# Altium footprint library UWRT_Footprint_Library_2020.PcbLib: 376 footprints (part 21 of 24)
Each footprint in its own frame and in the unit in brackets; x right, y up, seen from the top. Pads: shape width x height; smd on the part's side, far side on the other; paste and mask are expansions set on the pad; w line width, h text height; cw(c..) or ccw(c..) is an arc to the next point about the centre after c.
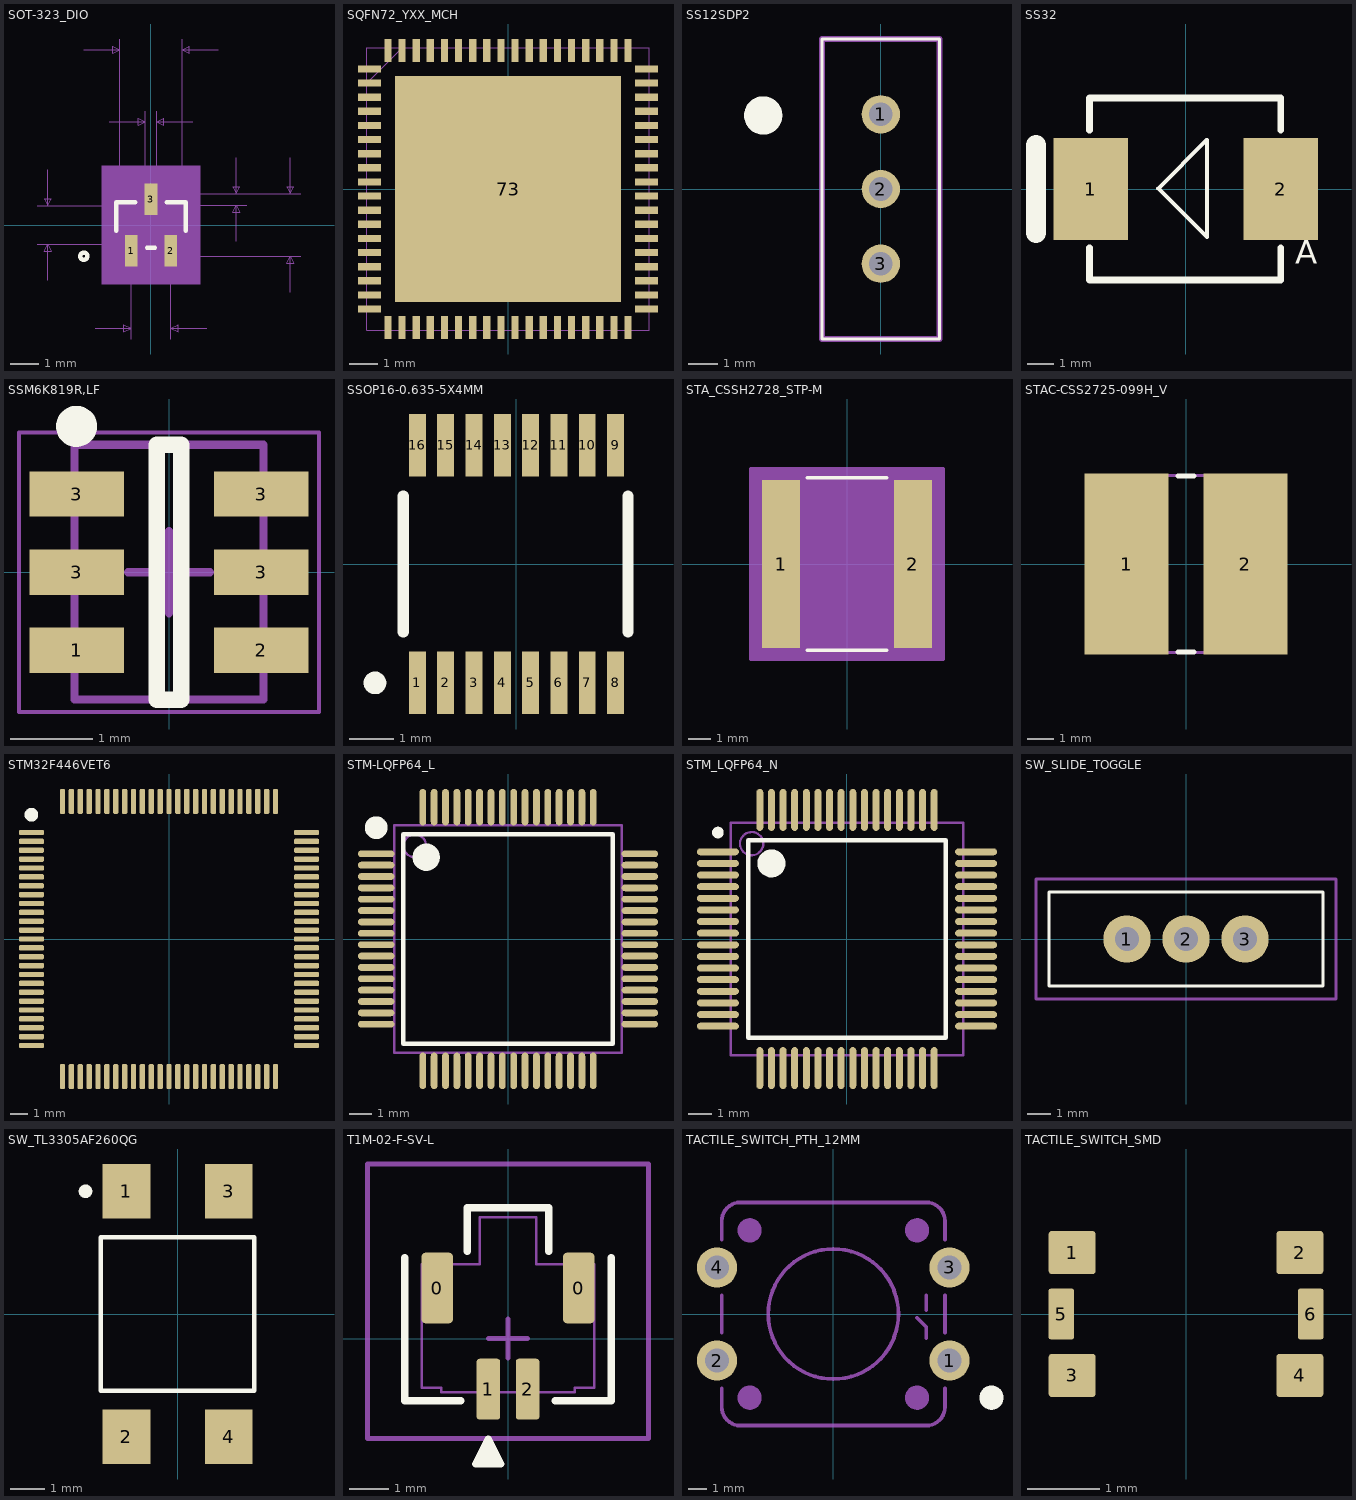
[diagram p20: the footprints below, top view; thin cyan lines are the x and y axes]

## SOT-323_DIO [mm]
pads (3):
  rect 0.451x1.111 smd paste+0 mask+0: 1(-0.7,-0.9) 2(0.7,-0.9) 3(0,0.9)
Top Overlay:
  circle w0.152: c-2.37,-1.1 r0.127
  lines w0.152: -1.227,-0.204 -1.227,0.802 -0.558,0.802 ; -0.142,-0.802 0.142,-0.802 ; 0.558,0.802 1.227,0.802 1.227,-0.204
Mechanical 5:
  region: -1.735,2.091 1.735,2.091 1.735,-2.091 -1.735,-2.091
Mechanical 7:
  lines w0.025: -4.021,-0.675 0,-0.675 ; -4.021,0.675 0,0.675 ; -3.64,-1.945 -3.64,-0.675 ; -3.64,1.945 -3.64,0.675 ; -2.37,6.18 -1.1,6.18 ; -1.97,-3.64 -0.7,-3.64 ; -1.47,3.64 -0.2,3.64 ; -1.1,0.675 -1.1,6.561 ; -0.7,-4.021 -0.7,-1.1 ; -0.2,1.1 -0.2,4.021 ; 0,-1.1 5.291,-1.1 ; 0,0.7 3.386,0.7 ; 0.2,1.1 0.2,4.021 ; 0.7,-4.021 0.7,-1.1 ; 1.1,0.675 1.1,6.561 ; 1.47,3.64 0.2,3.64 ; 1.97,-3.64 0.7,-3.64 ; 2.37,6.18 1.1,6.18 ; 3.005,-0.57 3.005,0.7 ; 3.005,2.37 3.005,1.1 ; 3.386,1.1 0,1.1 5.291,1.1 ; 4.91,-2.37 4.91,-1.1 ; 4.91,2.37 4.91,1.1 ; -3.64,-0.675 -3.513,-0.929 -3.767,-0.929 -3.64,-0.675 ; -3.64,0.675 -3.513,0.929 -3.767,0.929 -3.64,0.675 ; -1.1,6.18 -1.354,6.053 -1.354,6.307 -1.1,6.18 ; -0.7,-3.64 -0.954,-3.767 -0.954,-3.513 -0.7,-3.64 ; -0.2,3.64 -0.454,3.513 -0.454,3.767 -0.2,3.64 ; 0.2,3.64 0.454,3.513 0.454,3.767 0.2,3.64 ; 0.7,-3.64 0.954,-3.767 0.954,-3.513 0.7,-3.64 ; 1.1,6.18 1.354,6.053 1.354,6.307 1.1,6.18 ; 3.005,0.7 3.132,0.446 2.878,0.446 3.005,0.7 ; 3.005,1.1 3.132,1.354 2.878,1.354 3.005,1.1 ; 4.91,-1.1 5.037,-1.354 4.783,-1.354 4.91,-1.1 ; 4.91,1.1 5.037,1.354 4.783,1.354 4.91,1.1
  text "0.053in/1.35mm" at -8.593,-0.318 h0.64
  text "0.087in/2.2mm" at -2.064,6.688 h0.64
  text "0.016in/0.4mm" at -2.064,4.148 h0.64
  text "0.055in/1.4mm" at -2.064,-4.783 h0.64
  text "0.016in/0.4mm" at 3.513,0.583 h0.64
  text "0.087in/2.2mm" at 5.418,-0.318 h0.64
  text "Alt 2 Padstyle: OX90Y60D30P" at -8.572,-13.521 h1.27
  text "Alt 1 Padstyle: OX60Y90D30P" at -8.572,-11.616 h1.27
  text "Bottom Padstyle: RX17p75Y43p75D0T" at -10.477,-9.711 h1.27
  text "Top Padstyle: RX17p75Y43p75D0T" at -9.525,-7.806 h1.27
Mechanical 13:
  circle w0: c-0.846,-0.421 r0.127
  lines w0.025: -1.1,-0.675 -1.1,0.675 1.1,0.675 1.1,-0.675 -1.1,-0.675 ; -0.9,-1.1 -0.5,-1.1 -0.5,-0.675 -0.9,-0.675 -0.9,-1.1 ; -0.2,0.675 -0.2,1.1 0.2,1.1 0.2,0.675 -0.2,0.675 ; 0.5,-1.1 0.9,-1.1 0.9,-0.675 0.5,-0.675 0.5,-1.1
Mechanical 15:
  region: 1.1,-0.675 -1.1,-0.675 -1.1,0.675 1.1,0.675
  region: -1.354,-0.929 -1.354,0.929 -0.479,0.929 -0.479,1.71 0.479,1.71 0.479,0.929 1.354,0.929 1.354,-0.929 1.179,-0.929 1.179,-1.71 -1.179,-1.71 -1.179,-0.929
  lines w0.152: -1.354,-0.929 -1.179,-0.929 -1.179,-1.71 1.179,-1.71 1.179,-0.929 1.354,-0.929 1.354,0.929 0.479,0.929 0.479,1.71 -0.479,1.71 -0.479,0.929 -1.354,0.929 -1.354,-0.929
3D body: height 0.25, standoff 0, extent 0,0 0.254,0.254
3D body "SOT-323_DIO.step": height 1, standoff 0, extent -1.1,-1.1 1.1,1.1

## SQFN72_YXX_MCH [mil]
pads (73):
  rect 32x10 smd paste+0 mask+0: 1(-193,167.32) 2(-193,147.64) 3(-193,127.95) 4(-193,108.27) 5(-193,88.58) 6(-193,68.9) 7(-193,49.21) 8(-193,29.53) 9(-193,9.84) 10(-193,-9.84) 11(-193,-29.53) 12(-193,-49.21) 13(-193,-68.9) 14(-193,-88.58) 15(-193,-108.27) 16(-193,-127.95) 17(-193,-147.64) 18(-193,-167.32) 37(193,-167.32) 38(193,-147.64) 39(193,-127.95) 40(193,-108.27) 41(193,-88.58) 42(193,-68.9) 43(193,-49.21) 44(193,-29.53) 45(193,-9.84) 46(193,9.84) 47(193,29.53) 48(193,49.21) 49(193,68.9) 50(193,88.58) 51(193,108.27) 52(193,127.95) 53(193,147.64) 54(193,167.32)
  rect 10x32 smd paste+0 mask+0: 19(-167.32,-193) 20(-147.64,-193) 21(-127.95,-193) 22(-108.27,-193) 23(-88.58,-193) 24(-68.9,-193) 25(-49.21,-193) 26(-29.53,-193) 27(-9.84,-193) 28(9.84,-193) 29(29.53,-193) 30(49.21,-193) 31(68.9,-193) 32(88.58,-193) 33(108.27,-193) 34(127.95,-193) 35(147.64,-193) 36(167.32,-193) 55(167.32,193) 56(147.64,193) 57(127.95,193) 58(108.27,193) 59(88.58,193) 60(68.9,193) 61(49.21,193) 62(29.53,193) 63(9.84,193) 64(-9.84,193) 65(-29.53,193) 66(-49.21,193) 67(-68.9,193) 68(-88.58,193) 69(-108.27,193) 70(-127.95,193) 71(-147.64,193) 72(-167.32,193)
  rect 315x315 smd paste-157 mask+0: 73(0,0)
Top Paste:
  region: 153.56,-108.94 108.94,-108.94 108.94,-153.56 153.56,-153.56
  region: 153.56,-56.44 108.94,-56.44 108.94,-101.06 153.56,-101.06
  region: 153.56,-3.94 108.94,-3.94 108.94,-48.56 153.56,-48.56
  region: 153.56,48.56 108.94,48.56 108.94,3.94 153.56,3.94
  region: 153.56,101.06 108.94,101.06 108.94,56.44 153.56,56.44
  region: 153.56,153.56 108.94,153.56 108.94,108.94 153.56,108.94
  region: 101.06,-108.94 56.44,-108.94 56.44,-153.56 101.06,-153.56
  region: 101.06,-56.44 56.44,-56.44 56.44,-101.06 101.06,-101.06
  region: 101.06,-3.94 56.44,-3.94 56.44,-48.56 101.06,-48.56
  region: 101.06,48.56 56.44,48.56 56.44,3.94 101.06,3.94
  region: 101.06,101.06 56.44,101.06 56.44,56.44 101.06,56.44
  region: 101.06,153.56 56.44,153.56 56.44,108.94 101.06,108.94
  region: 48.56,-108.94 3.94,-108.94 3.94,-153.56 48.56,-153.56
  region: 48.56,-56.44 3.94,-56.44 3.94,-101.06 48.56,-101.06
  region: 48.56,-3.94 3.94,-3.94 3.94,-48.56 48.56,-48.56
  region: 48.56,48.56 3.94,48.56 3.94,3.94 48.56,3.94
  region: 48.56,101.06 3.94,101.06 3.94,56.44 48.56,56.44
  region: 48.56,153.56 3.94,153.56 3.94,108.94 48.56,108.94
  region: -3.94,-108.94 -48.56,-108.94 -48.56,-153.56 -3.94,-153.56
  region: -3.94,-56.44 -48.56,-56.44 -48.56,-101.06 -3.94,-101.06
  region: -3.94,-3.94 -48.56,-3.94 -48.56,-48.56 -3.94,-48.56
  region: -3.94,48.56 -48.56,48.56 -48.56,3.94 -3.94,3.94
  region: -3.94,101.06 -48.56,101.06 -48.56,56.44 -3.94,56.44
  region: -3.94,153.56 -48.56,153.56 -48.56,108.94 -3.94,108.94
  region: -56.44,-108.94 -101.06,-108.94 -101.06,-153.56 -56.44,-153.56
  region: -56.44,-56.44 -101.06,-56.44 -101.06,-101.06 -56.44,-101.06
  region: -56.44,-3.94 -101.06,-3.94 -101.06,-48.56 -56.44,-48.56
  region: -56.44,48.56 -101.06,48.56 -101.06,3.94 -56.44,3.94
  region: -56.44,101.06 -101.06,101.06 -101.06,56.44 -56.44,56.44
  region: -56.44,153.56 -101.06,153.56 -101.06,108.94 -56.44,108.94
  region: -108.94,-108.94 -153.56,-108.94 -153.56,-153.56 -108.94,-153.56
  region: -108.94,-56.44 -153.56,-56.44 -153.56,-101.06 -108.94,-101.06
  region: -108.94,-3.94 -153.56,-3.94 -153.56,-48.56 -108.94,-48.56
  region: -108.94,48.56 -153.56,48.56 -153.56,3.94 -108.94,3.94
  region: -108.94,101.06 -153.56,101.06 -153.56,56.44 -108.94,56.44
  region: -108.94,153.56 -153.56,153.56 -153.56,108.94 -108.94,108.94
Mechanical 13:
  lines w1: -197,147 -147,197 ; -197,-197 -197,197 197,197 197,-197 -197,-197 ; -197,-173.32 -197,-161.32 -197,-173.32 ; -197,-153.64 -197,-141.64 -197,-153.64 ; -197,-133.95 -197,-121.95 -197,-133.95 ; -197,-114.27 -197,-102.27 -197,-114.27 ; -197,-94.58 -197,-82.58 -197,-94.58 ; -197,-74.9 -197,-62.9 -197,-74.9 ; -197,-55.21 -197,-43.21 -197,-55.21 ; -197,-35.53 -197,-23.53 -197,-35.53 ; -197,-15.84 -197,-3.84 -197,-15.84 ; -197,3.84 -197,15.84 -197,3.84 ; -197,23.53 -197,35.53 -197,23.53 ; -197,43.21 -197,55.21 -197,43.21 ; -197,62.9 -197,74.9 -197,62.9 ; -197,82.58 -197,94.58 -197,82.58 ; -197,102.27 -197,114.27 -197,102.27 ; -197,121.95 -197,133.95 -197,121.95 ; -197,141.64 -197,153.64 -197,141.64 ; -197,161.32 -197,173.32 -197,161.32 ; -173.32,-197 -161.32,-197 -173.32,-197 ; -173.32,197 -161.32,197 -173.32,197 ; -153.64,-197 -141.64,-197 -153.64,-197 ; -153.64,197 -141.64,197 -153.64,197 ; -133.95,-197 -121.95,-197 -133.95,-197 ; -133.95,197 -121.95,197 -133.95,197 ; -114.27,-197 -102.27,-197 -114.27,-197 ; -114.27,197 -102.27,197 -114.27,197 ; -94.58,-197 -82.58,-197 -94.58,-197 ; -94.58,197 -82.58,197 -94.58,197 ; -74.9,-197 -62.9,-197 -74.9,-197 ; -74.9,197 -62.9,197 -74.9,197 ; -55.21,-197 -43.21,-197 -55.21,-197 ; -55.21,197 -43.21,197 -55.21,197 ; -35.53,-197 -23.53,-197 -35.53,-197 ; -35.53,197 -23.53,197 -35.53,197 ; -15.84,-197 -3.84,-197 -15.84,-197 ; -15.84,197 -3.84,197 -15.84,197 ; 3.84,-197 15.84,-197 3.84,-197 ; 3.84,197 15.84,197 3.84,197 ; 23.53,-197 35.53,-197 23.53,-197 ; 23.53,197 35.53,197 23.53,197 ; 43.21,-197 55.21,-197 43.21,-197 ; 43.21,197 55.21,197 43.21,197 ; 62.9,-197 74.9,-197 62.9,-197 ; 62.9,197 74.9,197 62.9,197 ; 82.58,-197 94.58,-197 82.58,-197 ; 82.58,197 94.58,197 82.58,197 ; 102.27,-197 114.27,-197 102.27,-197 ; 102.27,197 114.27,197 102.27,197 ; 121.95,-197 133.95,-197 121.95,-197 ; 121.95,197 133.95,197 121.95,197 ; 141.64,-197 153.64,-197 141.64,-197 ; 141.64,197 153.64,197 141.64,197 ; 161.32,-197 173.32,-197 161.32,-197 ; 161.32,197 173.32,197 161.32,197 ; 197,-173.32 197,-161.32 197,-173.32 ; 197,-153.64 197,-141.64 197,-153.64 ; 197,-133.95 197,-121.95 197,-133.95 ; 197,-114.27 197,-102.27 197,-114.27 ; 197,-94.58 197,-82.58 197,-94.58 ; 197,-74.9 197,-62.9 197,-74.9 ; 197,-55.21 197,-43.21 197,-55.21 ; 197,-35.53 197,-23.53 197,-35.53 ; 197,-15.84 197,-3.84 197,-15.84 ; 197,3.84 197,15.84 197,3.84 ; 197,23.53 197,35.53 197,23.53 ; 197,43.21 197,55.21 197,43.21 ; 197,62.9 197,74.9 197,62.9 ; 197,82.58 197,94.58 197,82.58 ; 197,102.27 197,114.27 197,102.27 ; 197,121.95 197,133.95 197,121.95 ; 197,141.64 197,153.64 197,141.64 ; 197,161.32 197,173.32 197,161.32
  text "*" at -189.5,152.17 h50
3D body: height 10, standoff 0, extent 0,0 10,10

## SS12SDP2 [mm]
pads (3):
  round 1.3 hole 0.8: 1(0,2.54) 2(0,0) 3(0,-2.54)
Top Overlay:
  circle w0.7: c-4,2.5 r0.3
  lines w0.1: -2,-5.1 -2,5.1 2,5.1 2,-5.1 -2,-5.1
Mechanical 13:
  lines w0.2: -2,-5.1 -2,5.1 2,5.1 2,-5.1 -2,-5.1
3D body "Switch_1.stp": height 6.35, standoff -3.15, extent -1.956,-5.105 2.032,5.105

## SS32 [mm] "Schottky Diode"
pads (2):
  rect 2.794x3.81 smd: 1(-3.555,0) 2(3.555,0)
Top Overlay:
  lines w0.154: 0.783,-1.783 -1.025,0.025 0.783,1.833 ; 0.8,-1.8 0.8,1.83
  lines w0.254: -3.6,-2.2 -3.6,-3.4 3.555,-3.4 3.555,-2.2 ; -3.6,2.2 -3.6,3.4 3.555,3.4 3.555,2.2
  lines w0.754: -5.6,-1.65 -5.6,1.65
  text "A" at 4.1,-3.1 h1.52
3D body: height 2.41, standoff 0, extent -3.6,-3.4 3.555,3.4

## SSM6K819R,LF [mm] "SOTFL, 6-Leads, Body 2.90x2.80mm, Pitch 0.95mm, IPC Medium Density"
height 0.88
pads (6):
  rect 1.15x0.55 smd: 1(-1.125,-0.95) 2(1.125,-0.95) 3(-1.125,0) 3(-1.125,0.95) 3(1.125,0) 3(1.125,0.95)
Top Overlay:
  circle w0.25: c-1.125,1.775 r0.125
  lines w0.2: -0.15,-1.55 0.15,-1.55 0.15,1.55 -0.15,1.55 -0.15,-1.55
Mechanical 13:
  lines w0.1: -1.15,-1.55 -1.15,1.55 1.15,1.55 1.15,-1.55 -1.15,-1.55
Mechanical 15:
  lines w0.05: -1.825,-1.7 -1.825,1.7 1.825,1.7 1.825,-1.7 -1.825,-1.7
  lines w0.1: -0.5,0 0.5,0 ; 0,-0.5 0,0.5
3D body "SSM6K819R,LF.step": height 0.88, standoff 0, extent -1.4,-1.548 1.4,1.548

## SSOP16-0.635-5X4MM [mil]
pads (16):
  rect 15x55 smd: 1(-87.5,-105) 2(-62.5,-105) 3(-37.5,-105) 4(-12.5,-105) 5(12.5,-105) 6(37.5,-105) 7(62.5,-105) 8(87.5,-105) 9(87.5,105) 10(62.5,105) 11(37.5,105) 12(12.5,105) 13(-12.5,105) 14(-37.5,105) 15(-62.5,105) 16(-87.5,105)
Top Overlay:
  circle w10: c-125,-105 r5
  lines w10: -100,-60 -100,60 ; 98.5,-60 98.5,60
3D body "SOIC_30XS-R_FTD.step": height 69.09, standoff 0, extent -98.51,-122 98.5,122.01

## STA_CSSH2728_STP-M [mil]
pads (2):
  rect 67x295 smd paste+0 mask+0: 1(-115.5,0) 2(115.5,0)
Top Overlay:
  lines w6: -69.53,-151.5 69.53,-151.5 ; -69.53,151.5 69.53,151.5
Mechanical 5:
  region: 164,-162.5 -164,-162.5 -164,162.5 164,162.5
Mechanical 13:
  lines w1: -137,-146.5 -137,146.5 ; -137,-146.5 137,-146.5 ; -137,-146.5 -82,-146.5 -82,146.5 -137,146.5 ; -137,-146.5 -137,146.5 ; -137,146.5 137,146.5 ; 137,-146.5 137,146.5 ; 137,-146.5 137,146.5 ; 137,-146.5 82,-146.5 82,146.5 137,146.5
Mechanical 15:
  region: 169,-167.5 -169,-167.5 -169,167.5 169,167.5
  lines w6: -169,-167.5 169,-167.5 169,167.5 -169,167.5 -169,-167.5
3D body "STA_CSSH2728_STP.step": height 49.02, standoff 0, extent -137.01,-146.5 137.01,146.5

## STAC-CSS2725-099H_V [mm] "Chip Resistor, 2-Leads, Body 7.06x6.7mm"
height 1.24
pads (2):
  rect 3.18x6.86 smd: 1(-2.25,0) 2(2.25,0)
Top Overlay:
  lines w0.2: -0.3,-3.33 0.3,-3.33 ; -0.3,3.33 0.3,3.33
Mechanical 13:
  lines w0.1: -3.53,-3.35 -3.53,3.35 3.53,3.35 3.53,-3.35 -3.53,-3.35
3D body "RESC6865X12L.step": height 1.24, standoff 0, extent -3.53,-3.35 3.53,3.35

## STM32F446VET6 [mm] "LQFP100"
pads (100):
  rrect50% 1.4x0.3 smd mask+0.051: 1(-7.75,6) 2(-7.75,5.5) 3(-7.75,5) 4(-7.75,4.5) 5(-7.75,4) 6(-7.75,3.5) 7(-7.75,3) 8(-7.75,2.5) 9(-7.75,2) 10(-7.75,1.5) 11(-7.75,1) 12(-7.75,0.5) 13(-7.75,0) 14(-7.75,-0.5) 15(-7.75,-1) 16(-7.75,-1.5) 17(-7.75,-2) 18(-7.75,-2.5) 19(-7.75,-3) 20(-7.75,-3.5) 21(-7.75,-4) 22(-7.75,-4.5) 23(-7.75,-5) 24(-7.75,-5.5) 25(-7.75,-6) 51(7.75,-6) 52(7.75,-5.5) 53(7.75,-5) 54(7.75,-4.5) 55(7.75,-4) 56(7.75,-3.5) 57(7.75,-3) 58(7.75,-2.5) 59(7.75,-2) 60(7.75,-1.5) 61(7.75,-1) 62(7.75,-0.5) 63(7.75,0) 64(7.75,0.5) 65(7.75,1) 66(7.75,1.5) 67(7.75,2) 68(7.75,2.5) 69(7.75,3) 70(7.75,3.5) 71(7.75,4) 72(7.75,4.5) 73(7.75,5) 74(7.75,5.5) 75(7.75,6)
  rrect50% 0.3x1.4 smd mask+0.051: 26(-6,-7.75) 27(-5.5,-7.75) 28(-5,-7.75) 29(-4.5,-7.75) 30(-4,-7.75) 31(-3.5,-7.75) 32(-3,-7.75) 33(-2.5,-7.75) 34(-2,-7.75) 35(-1.5,-7.75) 36(-1,-7.75) 37(-0.5,-7.75) 38(0,-7.75) 39(0.5,-7.75) 40(1,-7.75) 41(1.5,-7.75) 42(2,-7.75) 43(2.5,-7.75) 44(3,-7.75) 45(3.5,-7.75) 46(4,-7.75) 47(4.5,-7.75) 48(5,-7.75) 49(5.5,-7.75) 50(6,-7.75) 76(6,7.75) 77(5.5,7.75) 78(5,7.75) 79(4.5,7.75) 80(4,7.75) 81(3.5,7.75) 82(3,7.75) 83(2.5,7.75) 84(2,7.75) 85(1.5,7.75) 86(1,7.75) 87(0.5,7.75) 88(0,7.75) 89(-0.5,7.75) 90(-1,7.75) 91(-1.5,7.75) 92(-2,7.75) 93(-2.5,7.75) 94(-3,7.75) 95(-3.5,7.75) 96(-4,7.75) 97(-4.5,7.75) 98(-5,7.75) 99(-5.5,7.75) 100(-6,7.75)
Top Overlay:
  circle w0.508: c-7.75,7 r0.127
3D body "User Library-LQFP100.STEP": height 1.6, standoff 0, extent -8,-8 8,8

## STM-LQFP64_L [mm] "QFP, 64-Leads, Body 10x10mm, Pitch 0.5mm, IPC High Density"
height 1.6
pads (64):
  oval 1.6x0.3 smd: 1(-5.8,3.75) 2(-5.8,3.25) 3(-5.8,2.75) 4(-5.8,2.25) 5(-5.8,1.75) 6(-5.8,1.25) 7(-5.8,0.75) 8(-5.8,0.25) 9(-5.8,-0.25) 10(-5.8,-0.75) 11(-5.8,-1.25) 12(-5.8,-1.75) 13(-5.8,-2.25) 14(-5.8,-2.75) 15(-5.8,-3.25) 16(-5.8,-3.75) 33(5.8,-3.75) 34(5.8,-3.25) 35(5.8,-2.75) 36(5.8,-2.25) 37(5.8,-1.75) 38(5.8,-1.25) 39(5.8,-0.75) 40(5.8,-0.25) 41(5.8,0.25) 42(5.8,0.75) 43(5.8,1.25) 44(5.8,1.75) 45(5.8,2.25) 46(5.8,2.75) 47(5.8,3.25) 48(5.8,3.75)
  oval 0.3x1.6 smd: 17(-3.75,-5.8) 18(-3.25,-5.8) 19(-2.75,-5.8) 20(-2.25,-5.8) 21(-1.75,-5.8) 22(-1.25,-5.8) 23(-0.75,-5.8) 24(-0.25,-5.8) 25(0.25,-5.8) 26(0.75,-5.8) 27(1.25,-5.8) 28(1.75,-5.8) 29(2.25,-5.8) 30(2.75,-5.8) 31(3.25,-5.8) 32(3.75,-5.8) 49(3.75,5.8) 50(3.25,5.8) 51(2.75,5.8) 52(2.25,5.8) 53(1.75,5.8) 54(1.25,5.8) 55(0.75,5.8) 56(0.25,5.8) 57(-0.25,5.8) 58(-0.75,5.8) 59(-1.25,5.8) 60(-1.75,5.8) 61(-2.25,5.8) 62(-2.75,5.8) 63(-3.25,5.8) 64(-3.75,5.8)
Top Overlay:
  circle w0.6: c-3.6,3.6 r0.3
  circle w0.75: c-5.8,4.9 r0.125
  lines w0.2: -4.6,-4.6 4.6,-4.6 4.6,4.6 -4.6,4.6 -4.6,-4.6
Mechanical 13:
  circle w0.1: c-4.1,4.1 r0.5
  lines w0.1: -5,-5 5,-5 5,5 -5,5 -5,-5
3D body "LQFP64.step": height 1.56, standoff 0, extent -5.979,-6 6.021,6

## STM_LQFP64_N [mm] "Thin QFP, 64-Leads, Body 10x10mm, Pitch 0.5mm, IPC Medium Density"
height 1.6
pads (64):
  oval 1.8x0.3 smd mask+0.05: 1(-5.55,3.75) 2(-5.55,3.25) 3(-5.55,2.75) 4(-5.55,2.25) 5(-5.55,1.75) 6(-5.55,1.25) 7(-5.55,0.75) 8(-5.55,0.25) 9(-5.55,-0.25) 10(-5.55,-0.75) 11(-5.55,-1.25) 12(-5.55,-1.75) 13(-5.55,-2.25) 14(-5.55,-2.75) 15(-5.55,-3.25) 16(-5.55,-3.75) 33(5.55,-3.75) 34(5.55,-3.25) 35(5.55,-2.75) 36(5.55,-2.25) 37(5.55,-1.75) 38(5.55,-1.25) 39(5.55,-0.75) 40(5.55,-0.25) 41(5.55,0.25) 42(5.55,0.75) 43(5.55,1.25) 44(5.55,1.75) 45(5.55,2.25) 46(5.55,2.75) 47(5.55,3.25) 48(5.55,3.75)
  oval 0.3x1.8 smd mask+0.05: 17(-3.75,-5.55) 18(-3.25,-5.55) 19(-2.75,-5.55) 20(-2.25,-5.55) 21(-1.75,-5.55) 22(-1.25,-5.55) 23(-0.75,-5.55) 24(-0.25,-5.55) 25(0.25,-5.55) 26(0.75,-5.55) 27(1.25,-5.55) 28(1.75,-5.55) 29(2.25,-5.55) 30(2.75,-5.55) 31(3.25,-5.55) 32(3.75,-5.55) 49(3.75,5.55) 50(3.25,5.55) 51(2.75,5.55) 52(2.25,5.55) 53(1.75,5.55) 54(1.25,5.55) 55(0.75,5.55) 56(0.25,5.55) 57(-0.25,5.55) 58(-0.75,5.55) 59(-1.25,5.55) 60(-1.75,5.55) 61(-2.25,5.55) 62(-2.75,5.55) 63(-3.25,5.55) 64(-3.75,5.55)
Top Overlay:
  circle w0.6: c-3.25,3.25 r0.3
  circle w0.25: c-5.55,4.577 r0.125
  lines w0.2: -4.25,-4.25 4.25,-4.25 4.25,4.25 -4.25,4.25 -4.25,-4.25
Mechanical 13:
  circle w0.1: c-4.1,4.1 r0.5
  lines w0.1: -5,-5 5,-5 5,5 -5,5 -5,-5
3D body "LQFP64.step": height 1.56, standoff 0, extent -6,-5.99 6,6.01

## SW_SLIDE_TOGGLE [mm]
pads (3):
  round 2 hole 1: 1(-2.5,0) 2(0,0) 3(2.5,0)
Top Overlay:
  lines w0.127: -5.8,-2 -5.8,2 5.8,2 5.8,-2 -5.8,-2
Mechanical 15:
  lines w0.127: -6.35,-2.54 6.35,-2.54 6.35,2.54 -6.35,2.54 -6.35,-2.54
3D body "EG1218.stp": height 7, standoff -5.1, extent -5.8,-2 5.8,2

## SW_TL3305AF260QG [mm]
pads (4):
  rect 1.4x1.6 smd: 1(-1.5,3.6) 2(-1.5,-3.6) 3(1.5,3.6) 4(1.5,-3.6)
Top Overlay:
  circle w0.2: c-2.7,3.6 r0.1
  lines w0.127: -2.25,-2.25 -2.25,2.25 2.25,2.25 2.25,-2.25 -2.25,-2.25
3D body "TL3305AF260QG--3DModel-STEP-1.STEP": height 3.7, standoff -0.1, extent -2.25,-3.75 2.25,3.75

## T1M-02-F-SV-L [mm]
pads (4):
  rrect25% 0.8x1.8 smd: 0(-1.8,1.288) 0(1.8,1.288)
  rrect25% 0.6x1.55 smd: 1(-0.5,-1.287) 2(0.5,-1.287)
Top Overlay:
  region: -0.5,-2.557 -0.818,-3.192 -0.183,-3.192
  lines w0.191: -2.628,2.064 -2.628,-1.587 -1.199,-1.587 ; -1.04,2.222 -1.04,3.334 1.04,3.334 1.04,2.222 ; 1.199,-1.587 2.627,-1.587 2.627,2.064 ; -0.818,-3.192 -0.5,-2.557 -0.183,-3.192 -0.818,-3.192
Mechanical 1:
  lines w0.064: -2.2,-1.252 -2.2,1.887 -0.723,1.887 -0.723,3.088 0.722,3.088 0.722,1.887 2.2,1.887 2.2,-1.252 1.7,-1.252 1.7,-1.362 -1.7,-1.362 -1.7,-1.252 -2.2,-1.252
Mechanical 15:
  lines w0.127: -0.5,0 0.5,0 ; 0,-0.5 0,0.5 ; -3.58,-2.54 3.58,-2.54 3.58,4.445 -3.58,4.445 -3.58,-2.54
3D body "T1M-02-F-SV-L.stp": height 5.51, standoff 0.01, extent -2.2,-1.862 2.2,3.088

## TACTILE_SWITCH_PTH_12MM [mil]
pads (4):
  round 85 / inner round 60 / far side round 85 hole 51.18: 1(246.06,-98.43) 2(-246.06,-98.43) 3(246.06,98.43) 4(-246.06,98.43)
Top Overlay:
  circle w27.56: c334.65,-177.17 r11.81
Mechanical 3:
  lines w8: 177.17,-7.87 196.85,-27.56 196.85,-51.18 ; 196.85,7.87 196.85,39.37
Mechanical 7:
  circle w8: c0,0 r137.8
  circle w27.56: c-177.17,177.17 r11.81
  circle w27.56: c177.17,177.17 r11.81
  circle w27.56: c177.17,-177.17 r11.81
  circle w27.56: c-177.17,-177.17 r11.81
  lines w8: -236.22,-157.48 -236.22,-196.85 ccw(c-196.85,-196.85) -196.85,-236.22 196.85,-236.22 ccw(c196.85,-196.85) 236.22,-196.85 236.22,-157.48 ; -236.22,-39.37 -236.22,39.37 ; -236.22,157.48 -236.22,196.85 cw(c-196.85,196.85) -196.85,236.22 196.85,236.22 cw(c196.85,196.85) 236.22,196.85 236.22,157.48 ; 236.22,-39.37 236.22,39.37
3D body "User Library-SWT9.step": height 374.02, standoff -137.8, extent -274.07,-235.23 272.11,237.21

## TACTILE_SWITCH_SMD [mm]
pads (6):
  rrect15% 0.65x0.6 smd: 1(-1.575,0.85) 2(1.575,0.85) 3(-1.575,-0.85) 4(1.575,-0.85)
  rrect15% 0.35x0.7 smd: 5(-1.725,0) 6(1.725,0)
3D body "PUSH.step": height 1.6, standoff 0, extent -1.75,-1.35 1.75,1.35